# Altium footprint library FS_Footprints.PcbLib: 134 footprints (part 6 of 9)
Each footprint in its own frame and in the unit in brackets; x right, y up, seen from the top. Pads: shape width x height; smd on the part's side, far side on the other; paste and mask are expansions set on the pad; w line width, h text height; cw(c..) or ccw(c..) is an arc to the next point about the centre after c.
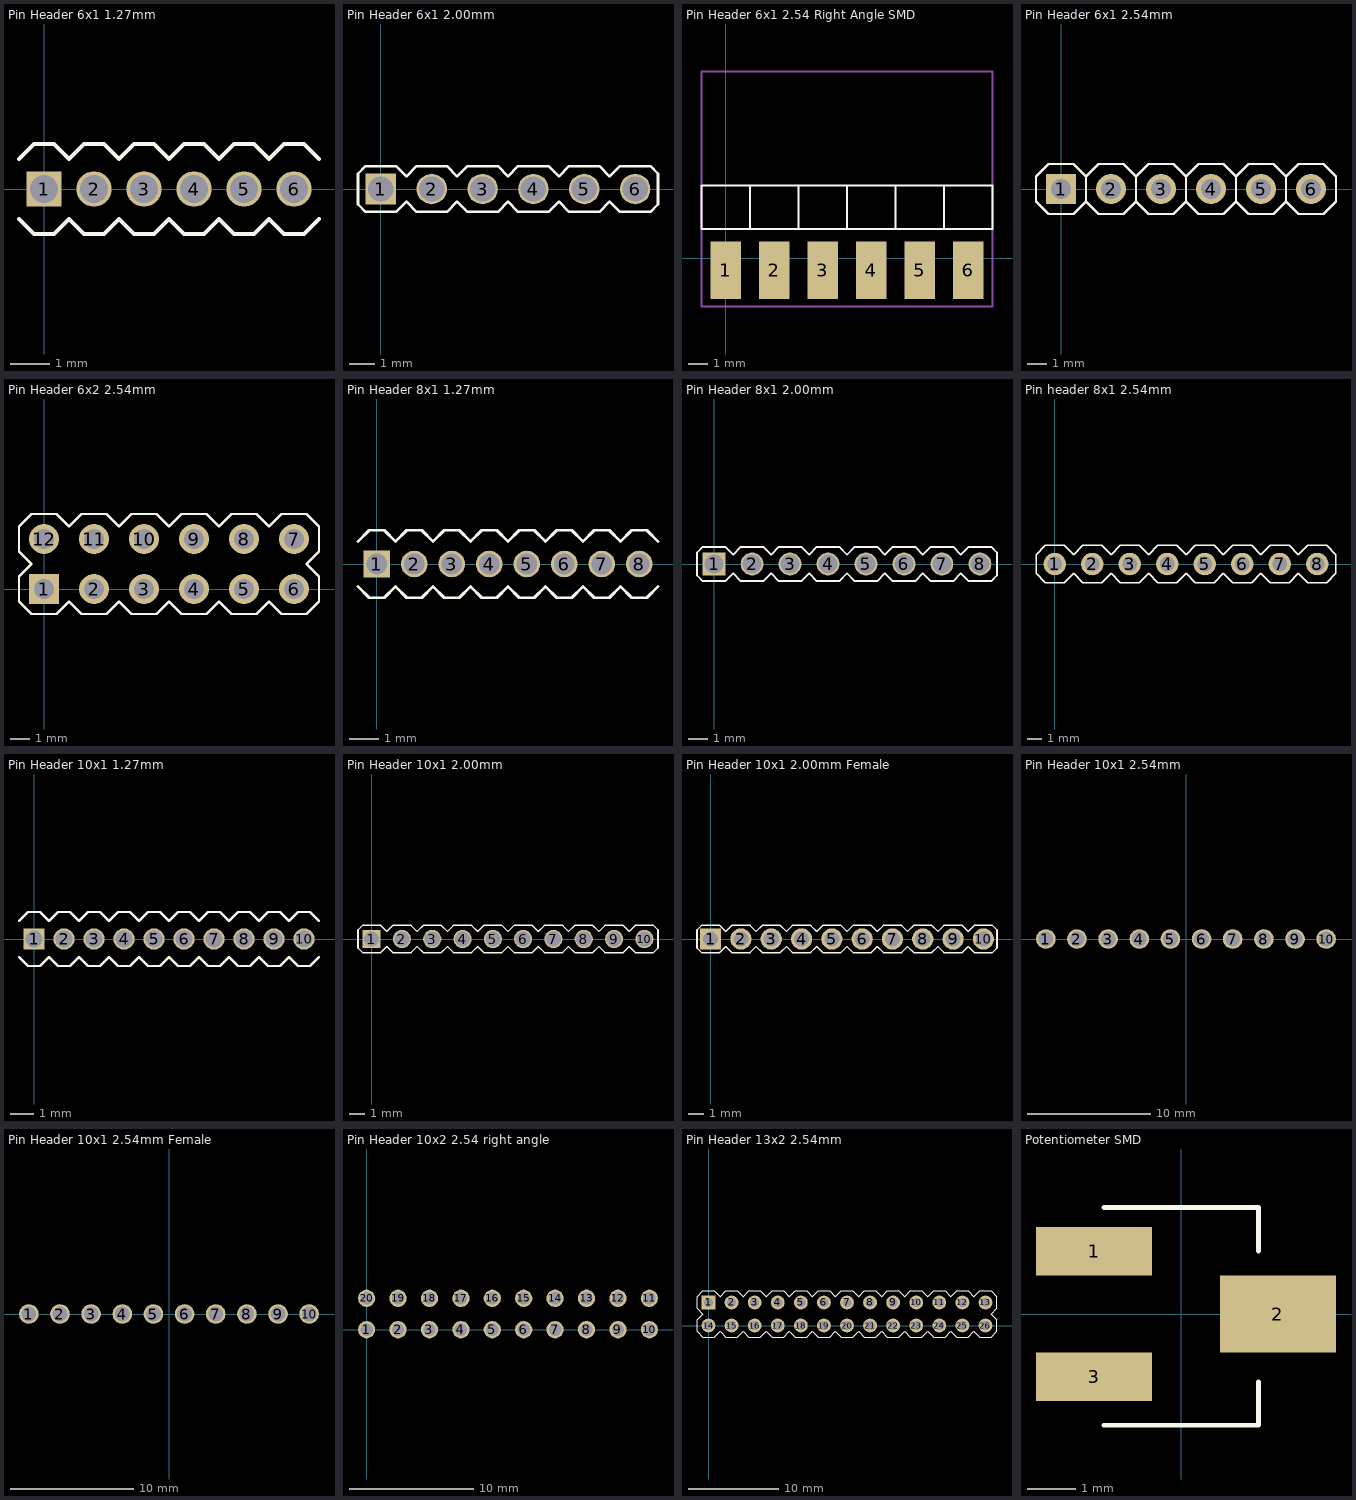
[diagram p5: the footprints below, top view; thin cyan lines are the x and y axes]

## Pin Header 6x1 1.27mm [mm]
pads (6):
  rect 0.9x0.9 hole 0.7: 1(0,0)
  round 0.9 hole 0.7: 2(1.27,0) 3(2.54,0) 4(3.81,0) 5(5.08,0) 6(6.35,0)
Top Overlay:
  lines w0.1: -0.635,-0.762 -0.254,-1.143 0.254,-1.143 0.635,-0.762 1.016,-1.143 1.524,-1.143 1.905,-0.762 2.286,-1.143 2.794,-1.143 3.175,-0.762 3.556,-1.143 4.064,-1.143 4.445,-0.762 4.826,-1.143 5.334,-1.143 5.715,-0.762 6.096,-1.143 6.604,-1.143 6.985,-0.762 ; -0.635,0.762 -0.254,1.143 0.254,1.143 0.635,0.762 1.016,1.143 1.524,1.143 1.905,0.762 2.286,1.143 2.794,1.143 3.175,0.762 3.556,1.143 4.064,1.143 4.445,0.762 4.826,1.143 5.334,1.143 5.715,0.762 6.096,1.143 6.604,1.143 6.985,0.762
3D body: height 5.8, standoff -2.3, extent -0.2,-0.2 0.2,0.2
3D body: height 2.54, standoff 0, extent -0.635,-1.27 0.635,1.27
3D body: height 2.54, standoff 0, extent 0.635,-1.27 1.905,1.27
3D body: height 5.8, standoff -2.3, extent 1.07,-0.2 1.47,0.2
3D body: height 2.54, standoff 0, extent 1.905,-1.27 3.175,1.27
3D body: height 5.8, standoff -2.3, extent 2.34,-0.2 2.74,0.2
3D body: height 2.54, standoff 0, extent 3.175,-1.27 4.445,1.27
3D body: height 5.8, standoff -2.3, extent 3.61,-0.2 4.01,0.2
3D body: height 5.8, standoff -2.3, extent 4.88,-0.2 5.28,0.2
3D body: height 2.54, standoff 0, extent 4.445,-1.27 5.715,1.27
3D body: height 5.8, standoff -2.3, extent 6.15,-0.2 6.55,0.2
3D body: height 2.54, standoff 0, extent 5.715,-1.27 6.985,1.27

## Pin Header 6x1 2.00mm [mm]
pads (6):
  rect 1.2x1.2 hole 1: 1(0,0)
  round 1.2 hole 1: 2(2,0) 3(4,0) 4(6,0) 5(8,0) 6(10,0)
Top Overlay:
  lines w0.1: -0.9,-0.6 -0.6,-0.9 0.6,-0.9 1,-0.5 1.4,-0.9 2.6,-0.9 3,-0.5 3.4,-0.9 4.6,-0.9 5,-0.5 5.4,-0.9 6.6,-0.9 7,-0.5 7.4,-0.9 8.6,-0.9 9,-0.5 9.4,-0.9 10.6,-0.9 10.9,-0.6 10.9,0.6 10.6,0.9 9.4,0.9 9,0.5 8.6,0.9 7.4,0.9 7,0.5 6.6,0.9 5.4,0.9 5,0.5 4.6,0.9 3.4,0.9 3,0.5 2.6,0.9 1.4,0.9 1,0.5 0.6,0.9 -0.6,0.9 -0.9,0.6 -0.9,-0.6
3D body: height 2, standoff 0, extent -1,-1 1,1
3D body: height 5.7, standoff -2.8, extent -0.25,-0.25 0.25,0.25
3D body: height 5.7, standoff -2.8, extent 1.75,-0.25 2.25,0.25
3D body: height 2, standoff 0, extent 1,-1 3,1
3D body: height 5.7, standoff -2.8, extent 3.75,-0.25 4.25,0.25
3D body: height 2, standoff 0, extent 3,-1 5,1
3D body: height 5.7, standoff -2.8, extent 5.75,-0.25 6.25,0.25
3D body: height 2, standoff 0, extent 5,-1 7,1
3D body: height 2, standoff 0, extent 9,-1 11,1
3D body: height 5.7, standoff -2.8, extent 9.75,-0.25 10.25,0.25
3D body: height 2, standoff 0, extent 7,-1 9,1
3D body: height 5.7, standoff -2.8, extent 7.75,-0.25 8.25,0.25

## Pin Header 6x1 2.54 Right Angle SMD [mm]
pads (6):
  rect 1.6x3 smd: 1(0,-0.635) 2(2.54,-0.635) 3(5.08,-0.635) 4(7.62,-0.635) 5(10.16,-0.635) 6(12.7,-0.635)
Top Overlay:
  lines w0.1: 1.27,1.524 1.27,2.54 1.27,3.81 ; 3.81,1.524 -1.27,1.524 -1.27,3.81 3.81,3.81 ; 3.81,1.524 3.81,3.81 ; 3.81,1.524 6.35,1.524 ; 3.81,3.81 6.35,3.81 ; 6.35,1.524 6.35,3.81 ; 6.35,1.524 6.35,1.524 ; 6.35,1.524 8.89,1.524 ; 6.35,3.81 6.35,3.81 ; 6.35,3.81 8.89,3.81 ; 8.89,1.524 8.89,3.81 ; 8.89,1.524 11.43,1.524 ; 8.89,3.81 11.43,3.81 ; 11.43,1.524 13.97,1.524 13.97,3.81 11.43,3.81 ; 11.43,1.524 11.43,3.81
Mechanical 15:
  lines w0.1: -1.27,-2.54 -1.27,9.779 13.97,9.779 13.97,1.524 13.97,-2.54 -1.27,-2.54
3D body "User Library-Header_Male_6Pin.STEP": height 2.51, standoff 0.03, extent -1.27,-1.27 13.97,10.27

## Pin Header 6x1 2.54mm [mil]
pads (6):
  rect 60x60 hole 39.37: 1(0,0)
  round 60 hole 39.37: 2(100,0) 3(200,0) 4(300,0) 5(400,0) 6(500,0)
Top Overlay:
  lines w3.94: 50,-25 75,-50 125,-50 150,-25 ; 50,-25 25,-50 -25,-50 -50,-25 -50,25 -25,50 25,50 50,25 ; 50,-25 50,25 ; 50,25 75,50 125,50 150,25 ; 150,-25 150,25 ; 150,-25 175,-50 225,-50 250,-25 ; 150,25 175,50 225,50 250,25 ; 250,-25 250,25 ; 250,-25 275,-50 325,-50 350,-25 ; 250,25 275,50 325,50 350,25 ; 350,-25 350,25 ; 350,-25 375,-50 425,-50 450,-25 ; 350,25 375,50 425,50 450,25 ; 450,-25 450,25 ; 450,-25 475,-50 525,-50 550,-25 550,25 525,50 475,50 450,25 ; 450,-25 450,25
3D body "User Library-Header_Male_6Pin.STEP": height 336.22, standoff -118.11, extent -50,-50 550,48.03

## Pin Header 6x2 2.54mm [mil]
pads (12):
  rect 60x60 hole 39.37: 1(0,0)
  round 60 hole 39.37: 2(100,0) 3(200,0) 4(300,0) 5(400,0) 6(500,0) 7(500,100) 8(400,100) 9(300,100) 10(200,100) 11(100,100) 12(0,100)
Top Overlay:
  lines w3.94: -50,-25 -25,-50 25,-50 50,-25 75,-50 125,-50 150,-25 175,-50 225,-50 250,-25 275,-50 325,-50 350,-25 375,-50 425,-50 450,-25 475,-50 525,-50 550,-25 550,25 525,50 550,75 550,125 525,150 475,150 450,125 425,150 375,150 350,125 325,150 275,150 250,125 225,150 175,150 150,125 125,150 75,150 50,125 25,150 -25,150 -50,125 -50,75 -25,50 -50,25 -50,-25
3D body "User Library-Header_Male_6Pin.STEP": height 336.22, standoff -118.11, extent -50,50 550,148.03
3D body "User Library-Header_Male_6Pin.STEP": height 336.22, standoff -118.11, extent -50,-50 550,48.03

## Pin Header 8x1 1.27mm [mm]
pads (8):
  rect 0.9x0.9 hole 0.7: 1(0,0)
  round 0.9 hole 0.7: 2(1.27,0) 3(2.54,0) 4(3.81,0) 5(5.08,0) 6(6.35,0) 7(7.62,0) 8(8.89,0)
Top Overlay:
  lines w0.1: -0.635,-0.762 -0.254,-1.143 0.254,-1.143 0.635,-0.762 1.016,-1.143 1.524,-1.143 1.905,-0.762 2.286,-1.143 2.794,-1.143 3.175,-0.762 3.556,-1.143 4.064,-1.143 4.445,-0.762 4.826,-1.143 5.334,-1.143 5.715,-0.762 6.096,-1.143 6.604,-1.143 6.985,-0.762 7.366,-1.143 7.874,-1.143 8.255,-0.762 8.636,-1.143 9.144,-1.143 9.525,-0.762 ; -0.635,0.762 -0.254,1.143 0.254,1.143 0.635,0.762 1.016,1.143 1.524,1.143 1.905,0.762 2.286,1.143 2.794,1.143 3.175,0.762 3.556,1.143 4.064,1.143 4.445,0.762 4.826,1.143 5.334,1.143 5.715,0.762 6.096,1.143 6.604,1.143 6.985,0.762 7.366,1.143 7.874,1.143 8.255,0.762 8.636,1.143 9.144,1.143 9.525,0.762
3D body: height 2.54, standoff 0, extent 8.255,-1.27 9.525,1.27
3D body: height 5.8, standoff -2.3, extent 8.69,-0.2 9.09,0.2
3D body: height 2.54, standoff 0, extent 6.985,-1.27 8.255,1.27
3D body: height 5.8, standoff -2.3, extent 7.42,-0.2 7.82,0.2
3D body: height 2.54, standoff 0, extent 5.715,-1.27 6.985,1.27
3D body: height 5.8, standoff -2.3, extent 6.15,-0.2 6.55,0.2
3D body: height 2.54, standoff 0, extent 4.445,-1.27 5.715,1.27
3D body: height 5.8, standoff -2.3, extent 4.88,-0.2 5.28,0.2
3D body: height 5.8, standoff -2.3, extent 3.61,-0.2 4.01,0.2
3D body: height 2.54, standoff 0, extent 3.175,-1.27 4.445,1.27
3D body: height 5.8, standoff -2.3, extent 2.34,-0.2 2.74,0.2
3D body: height 2.54, standoff 0, extent 1.905,-1.27 3.175,1.27
3D body: height 5.8, standoff -2.3, extent 1.07,-0.2 1.47,0.2
3D body: height 2.54, standoff 0, extent 0.635,-1.27 1.905,1.27
3D body: height 2.54, standoff 0, extent -0.635,-1.27 0.635,1.27
3D body: height 5.8, standoff -2.3, extent -0.2,-0.2 0.2,0.2

## Pin Header 8x1 2.00mm [mm]
pads (8):
  rect 1.2x1.2 hole 1: 1(0,0)
  round 1.2 hole 1: 2(2,0) 3(4,0) 4(6,0) 5(8,0) 6(10,0) 7(12,0) 8(14,0)
Top Overlay:
  lines w0.1: -0.9,-0.6 -0.6,-0.9 0.6,-0.9 1,-0.5 1.4,-0.9 2.6,-0.9 3,-0.5 3.4,-0.9 4.6,-0.9 5,-0.5 5.4,-0.9 6.6,-0.9 7,-0.5 7.4,-0.9 8.6,-0.9 9,-0.5 9.4,-0.9 10.6,-0.9 11,-0.5 11.4,-0.9 12.6,-0.9 13,-0.5 13.4,-0.9 14.6,-0.9 14.9,-0.6 14.9,0.6 14.6,0.9 13.4,0.9 13,0.5 12.6,0.9 11.4,0.9 11,0.5 10.6,0.9 9.4,0.9 9,0.5 8.6,0.9 7.4,0.9 7,0.5 6.6,0.9 5.4,0.9 5,0.5 4.6,0.9 3.4,0.9 3,0.5 2.6,0.9 1.4,0.9 1,0.5 0.6,0.9 -0.6,0.9 -0.9,0.6 -0.9,-0.6
3D body: height 2, standoff 0, extent -1,-1 1,1
3D body: height 5.7, standoff -2.8, extent -0.25,-0.25 0.25,0.25
3D body: height 5.7, standoff -2.8, extent 1.75,-0.25 2.25,0.25
3D body: height 2, standoff 0, extent 1,-1 3,1
3D body: height 5.7, standoff -2.8, extent 3.75,-0.25 4.25,0.25
3D body: height 2, standoff 0, extent 3,-1 5,1
3D body: height 5.7, standoff -2.8, extent 5.75,-0.25 6.25,0.25
3D body: height 2, standoff 0, extent 5,-1 7,1
3D body: height 2, standoff 0, extent 9,-1 11,1
3D body: height 5.7, standoff -2.8, extent 9.75,-0.25 10.25,0.25
3D body: height 2, standoff 0, extent 7,-1 9,1
3D body: height 5.7, standoff -2.8, extent 7.75,-0.25 8.25,0.25
3D body: height 5.7, standoff -2.8, extent 11.75,-0.25 12.25,0.25
3D body: height 2, standoff 0, extent 11,-1 13,1
3D body: height 5.7, standoff -2.8, extent 13.75,-0.25 14.25,0.25
3D body: height 2, standoff 0, extent 13,-1 15,1

## Pin header 8x1 2.54mm [mil]
pads (8):
  round 60 hole 39.37: 1(0,0) 2(100,0) 3(200,0) 4(300,0) 5(400,0) 6(500,0) 7(600,0) 8(700,0)
Top Overlay:
  lines w3.94: -50,-25 -50,25 -25,50 25,50 50,25 75,50 125,50 150,25 175,50 225,50 250,25 275,50 325,50 350,25 375,50 425,50 450,25 475,50 525,50 550,25 575,50 625,50 650,25 675,50 725,50 750,25 750,-25 725,-50 675,-50 650,-25 625,-50 575,-50 550,-25 525,-50 475,-50 450,-25 425,-50 375,-50 350,-25 325,-50 275,-50 250,-25 225,-50 175,-50 150,-25 125,-50 75,-50 50,-25 25,-50 -25,-50 -50,-25
3D body "User Library-Header_Male_4Pin.STEP": height 336.22, standoff -118.11, extent 350.01,-49.01 750.01,49.02
3D body "User Library-Header_Male_4Pin.STEP": height 336.22, standoff -118.11, extent -49.99,-49.01 350.01,49.02

## Pin Header 10x1 1.27mm [mm]
pads (10):
  rect 0.9x0.9 hole 0.7: 1(0,0)
  round 0.9 hole 0.7: 2(1.27,0) 3(2.54,0) 4(3.81,0) 5(5.08,0) 6(6.35,0) 7(7.62,0) 8(8.89,0) 9(10.16,0) 10(11.43,0)
Top Overlay:
  lines w0.1: -0.635,-0.762 -0.254,-1.143 0.254,-1.143 0.635,-0.762 1.016,-1.143 1.524,-1.143 1.905,-0.762 2.286,-1.143 2.794,-1.143 3.175,-0.762 3.556,-1.143 4.064,-1.143 4.445,-0.762 4.826,-1.143 5.334,-1.143 5.715,-0.762 6.096,-1.143 6.604,-1.143 6.985,-0.762 7.366,-1.143 7.874,-1.143 8.255,-0.762 8.636,-1.143 9.144,-1.143 9.525,-0.762 9.906,-1.143 10.414,-1.143 10.795,-0.762 11.176,-1.143 11.684,-1.143 12.065,-0.762 ; -0.635,0.762 -0.254,1.143 0.254,1.143 0.635,0.762 1.016,1.143 1.524,1.143 1.905,0.762 2.286,1.143 2.794,1.143 3.175,0.762 3.556,1.143 4.064,1.143 4.445,0.762 4.826,1.143 5.334,1.143 5.715,0.762 6.096,1.143 6.604,1.143 6.985,0.762 7.366,1.143 7.874,1.143 8.255,0.762 8.636,1.143 9.144,1.143 9.525,0.762 9.906,1.143 10.414,1.143 10.795,0.762 11.176,1.143 11.684,1.143 12.065,0.762
3D body: height 5.8, standoff -2.3, extent -0.2,-0.2 0.2,0.2
3D body: height 2.54, standoff 0, extent -0.635,-1.27 0.635,1.27
3D body: height 2.54, standoff 0, extent 0.635,-1.27 1.905,1.27
3D body: height 5.8, standoff -2.3, extent 1.07,-0.2 1.47,0.2
3D body: height 2.54, standoff 0, extent 1.905,-1.27 3.175,1.27
3D body: height 5.8, standoff -2.3, extent 2.34,-0.2 2.74,0.2
3D body: height 2.54, standoff 0, extent 3.175,-1.27 4.445,1.27
3D body: height 5.8, standoff -2.3, extent 3.61,-0.2 4.01,0.2
3D body: height 5.8, standoff -2.3, extent 4.88,-0.2 5.28,0.2
3D body: height 2.54, standoff 0, extent 4.445,-1.27 5.715,1.27
3D body: height 5.8, standoff -2.3, extent 6.15,-0.2 6.55,0.2
3D body: height 2.54, standoff 0, extent 5.715,-1.27 6.985,1.27
3D body: height 5.8, standoff -2.3, extent 7.42,-0.2 7.82,0.2
3D body: height 2.54, standoff 0, extent 6.985,-1.27 8.255,1.27
3D body: height 5.8, standoff -2.3, extent 8.69,-0.2 9.09,0.2
3D body: height 2.54, standoff 0, extent 8.255,-1.27 9.525,1.27
3D body: height 5.8, standoff -2.3, extent 9.96,-0.2 10.36,0.2
3D body: height 2.54, standoff 0, extent 9.525,-1.27 10.795,1.27
3D body: height 5.8, standoff -2.3, extent 11.23,-0.2 11.63,0.2
3D body: height 2.54, standoff 0, extent 10.795,-1.27 12.065,1.27

## Pin Header 10x1 2.00mm [mm]
pads (10):
  rect 1.2x1.2 hole 1: 1(0,0)
  round 1.2 hole 1: 2(2,0) 3(4,0) 4(6,0) 5(8,0) 6(10,0) 7(12,0) 8(14,0) 9(16,0) 10(18,0)
Top Overlay:
  lines w0.1: -0.9,-0.6 -0.9,0.6 -0.6,0.9 0.6,0.9 1,0.5 1.4,0.9 2.6,0.9 3,0.5 3.4,0.9 4.6,0.9 5,0.5 5.4,0.9 6.6,0.9 7,0.5 7.4,0.9 8.6,0.9 9,0.5 9.4,0.9 10.6,0.9 11,0.5 11.4,0.9 12.6,0.9 13,0.5 13.4,0.9 14.6,0.9 15,0.5 15.4,0.9 16.6,0.9 17,0.5 17.4,0.9 18.6,0.9 18.9,0.6 18.9,-0.6 18.6,-0.9 17.4,-0.9 17,-0.5 16.6,-0.9 15.4,-0.9 15,-0.5 14.6,-0.9 13.4,-0.9 13,-0.5 12.6,-0.9 11.4,-0.9 11,-0.5 10.6,-0.9 9.4,-0.9 9,-0.5 8.6,-0.9 7.4,-0.9 7,-0.5 6.6,-0.9 5.4,-0.9 5,-0.5 4.6,-0.9 3.4,-0.9 3,-0.5 2.6,-0.9 1.4,-0.9 1,-0.5 0.6,-0.9 -0.6,-0.9 -0.9,-0.6
3D body: height 5.7, standoff -2.8, extent 15.75,-0.25 16.25,0.25
3D body: height 2, standoff 0, extent 15,-1 17,1
3D body: height 5.7, standoff -2.8, extent 17.75,-0.25 18.25,0.25
3D body: height 2, standoff 0, extent 17,-1 19,1
3D body: height 2, standoff 0, extent 13,-1 15,1
3D body: height 5.7, standoff -2.8, extent 13.75,-0.25 14.25,0.25
3D body: height 2, standoff 0, extent 11,-1 13,1
3D body: height 5.7, standoff -2.8, extent 11.75,-0.25 12.25,0.25
3D body: height 5.7, standoff -2.8, extent 7.75,-0.25 8.25,0.25
3D body: height 2, standoff 0, extent 7,-1 9,1
3D body: height 5.7, standoff -2.8, extent 9.75,-0.25 10.25,0.25
3D body: height 2, standoff 0, extent 9,-1 11,1
3D body: height 2, standoff 0, extent 5,-1 7,1
3D body: height 5.7, standoff -2.8, extent 5.75,-0.25 6.25,0.25
3D body: height 2, standoff 0, extent 3,-1 5,1
3D body: height 5.7, standoff -2.8, extent 3.75,-0.25 4.25,0.25
3D body: height 2, standoff 0, extent 1,-1 3,1
3D body: height 5.7, standoff -2.8, extent 1.75,-0.25 2.25,0.25
3D body: height 5.7, standoff -2.8, extent -0.25,-0.25 0.25,0.25
3D body: height 2, standoff 0, extent -1,-1 1,1

## Pin Header 10x1 2.00mm Female [mm]
pads (10):
  rect 1.4x1.4 hole 1: 1(0,0)
  round 1.4 hole 1: 2(2,0) 3(4,0) 4(6,0) 5(8,0) 6(10,0) 7(12,0) 8(14,0) 9(16,0) 10(18,0)
Top Overlay:
  lines w0.1: -0.9,-0.6 -0.6,-0.9 0.6,-0.9 1,-0.5 1.4,-0.9 2.6,-0.9 3,-0.5 3.4,-0.9 4.6,-0.9 5,-0.5 5.4,-0.9 6.6,-0.9 7,-0.5 7.4,-0.9 8.6,-0.9 9,-0.5 9.4,-0.9 10.6,-0.9 11,-0.5 11.4,-0.9 12.6,-0.9 13,-0.5 13.4,-0.9 14.6,-0.9 15,-0.5 15.4,-0.9 16.6,-0.9 17,-0.5 17.4,-0.9 18.6,-0.9 18.9,-0.6 18.9,0.6 18.6,0.9 17.4,0.9 17,0.5 16.6,0.9 15.4,0.9 15,0.5 14.6,0.9 13.4,0.9 13,0.5 12.6,0.9 11.4,0.9 11,0.5 10.6,0.9 9.4,0.9 9,0.5 8.6,0.9 7.4,0.9 7,0.5 6.6,0.9 5.4,0.9 5,0.5 4.6,0.9 3.4,0.9 3,0.5 2.6,0.9 1.4,0.9 1,0.5 0.6,0.9 -0.6,0.9 -0.9,0.6 -0.9,-0.6
3D body "User Library-PBS2-10-1.STEP": height 4.3, standoff -3.15, extent -1,-1 19,1

## Pin Header 10x1 2.54mm [mm]
pads (10):
  round 1.6 hole 1.2: 1(-11.43,0) 2(-8.89,0) 3(-6.35,0) 4(-3.81,0) 5(-1.27,0) 6(1.27,0) 7(3.81,0) 8(6.35,0) 9(8.89,0) 10(11.43,0)
3D body "User Library-Header_Male_10Pin.STEP": height 8.54, standoff -3, extent -12.7,-1.245 12.7,1.245

## Pin Header 10x1 2.54mm Female [mm]
pads (10):
  round 1.6 hole 1.2: 1(-11.43,0) 2(-8.89,0) 3(-6.35,0) 4(-3.81,0) 5(-1.27,0) 6(1.27,0) 7(3.81,0) 8(6.35,0) 9(8.89,0) 10(11.43,0)
3D body "Samtec-ESQ-110-13-L-S.step": height 11.05, standoff -7.37, extent -12.954,-1.27 12.954,1.27

## Pin Header 10x2 2.54 right angle [mm]
pads (20):
  round 1.4 hole 1: 1(0,0) 2(2.54,0) 3(5.08,0) 4(7.62,0) 5(10.16,0) 6(12.7,0) 7(15.24,0) 8(17.78,0) 9(20.32,0) 10(22.86,0) 11(22.86,2.54) 12(20.32,2.54) 13(17.78,2.54) 14(15.24,2.54) 15(12.7,2.54) 16(10.16,2.54) 17(7.62,2.54) 18(5.08,2.54) 19(2.54,2.54) 20(0,2.54)
3D body "901220770.stp": height 6.17, standoff -2.88, extent -1.3,-11.025 24.1,2.825

## Pin Header 13x2 2.54mm [mil]
pads (26):
  rect 60x60 hole 39.37: 1(0,100)
  round 60 hole 39.37: 2(100,100) 3(200,100) 4(300,100) 5(400,100) 6(500,100) 7(600,100) 8(700,100) 9(800,100) 10(900,100) 11(1000,100) 12(1100,100) 13(1200,100) 14(0,0) 15(100,0) 16(200,0) 17(300,0) 18(400,0) 19(500,0) 20(600,0) 21(700,0) 22(800,0) 23(900,0) 24(1000,0) 25(1100,0) 26(1200,0)
Top Overlay:
  lines w3.94: -50,-25 -25,-50 25,-50 50,-25 75,-50 125,-50 150,-25 175,-50 225,-50 250,-25 275,-50 325,-50 350,-25 375,-50 425,-50 450,-25 475,-50 525,-50 550,-25 575,-50 625,-50 650,-25 675,-50 725,-50 750,-25 775,-50 825,-50 850,-25 875,-50 925,-50 950,-25 975,-50 1025,-50 1050,-25 1075,-50 1125,-50 1150,-25 1175,-50 1225,-50 1250,-25 1250,25 1225,50 1250,75 1250,125 1225,150 1175,150 1150,125 1125,150 1075,150 1050,125 1025,150 975,150 950,125 925,150 875,150 850,125 825,150 775,150 750,125 725,150 675,150 650,125 625,150 575,150 550,125 525,150 475,150 450,125 425,150 375,150 350,125 325,150 275,150 250,125 225,150 175,150 150,125 125,150 75,150 50,125 25,150 -25,150 -50,125 -50,75 -25,50 -50,25 -50,-25
3D body "User Library-Header_Male_2Pin.STEP": height 336.22, standoff -118.11, extent -49.02,-49.99 49.01,150.01
3D body "User Library-Header_Male_2Pin.STEP": height 336.22, standoff -118.11, extent 50.98,-49.99 149.01,150.01
3D body "User Library-Header_Male_2Pin.STEP": height 336.22, standoff -118.11, extent 150.98,-49.99 249.01,150.01
3D body "User Library-Header_Male_2Pin.STEP": height 336.22, standoff -118.11, extent 250.98,-49.99 349.01,150.01
3D body "User Library-Header_Male_2Pin.STEP": height 336.22, standoff -118.11, extent 350.98,-49.99 449.01,150.01
3D body "User Library-Header_Male_2Pin.STEP": height 336.22, standoff -118.11, extent 450.98,-49.99 549.01,150.01
3D body "User Library-Header_Male_2Pin.STEP": height 336.22, standoff -118.11, extent 550.98,-49.99 649.01,150.01
3D body "User Library-Header_Male_2Pin.STEP": height 336.22, standoff -118.11, extent 650.98,-49.99 749.01,150.01
3D body "User Library-Header_Male_2Pin.STEP": height 336.22, standoff -118.11, extent 750.98,-49.99 849.01,150.01
3D body "User Library-Header_Male_2Pin.STEP": height 336.22, standoff -118.11, extent 850.98,-49.99 949.01,150.01
3D body "User Library-Header_Male_2Pin.STEP": height 336.22, standoff -118.11, extent 950.98,-49.99 1049.01,150.01
3D body "User Library-Header_Male_2Pin.STEP": height 336.22, standoff -118.11, extent 1050.98,-49.99 1149.01,150.01
3D body "User Library-Header_Male_2Pin.STEP": height 336.22, standoff -118.11, extent 1150.98,-49.99 1249.01,150.01

## Potentiometer SMD [mm]
pads (3):
  rect 2.4x1 smd: 1(-1.8,1.3) 3(-1.8,-1.3)
  rect 2.4x1.6 smd: 2(2,0)
Top Overlay:
  lines w0.1: -1.6,-2.3 1.6,-2.3 1.6,-1.4 ; -1.6,2.2 1.6,2.2 1.6,1.3
3D body "User Library-Pot 3214.step": height 5.1, standoff -0.3, extent -1.97,-2.4 1.97,2.4